# Altium footprint library Components.PcbLib: 139 footprints (part 8 of 9)
Each footprint in its own frame and in the unit in brackets; x right, y up, seen from the top. Pads: shape width x height; smd on the part's side, far side on the other; paste and mask are expansions set on the pad; w line width, h text height; cw(c..) or ccw(c..) is an arc to the next point about the centre after c.
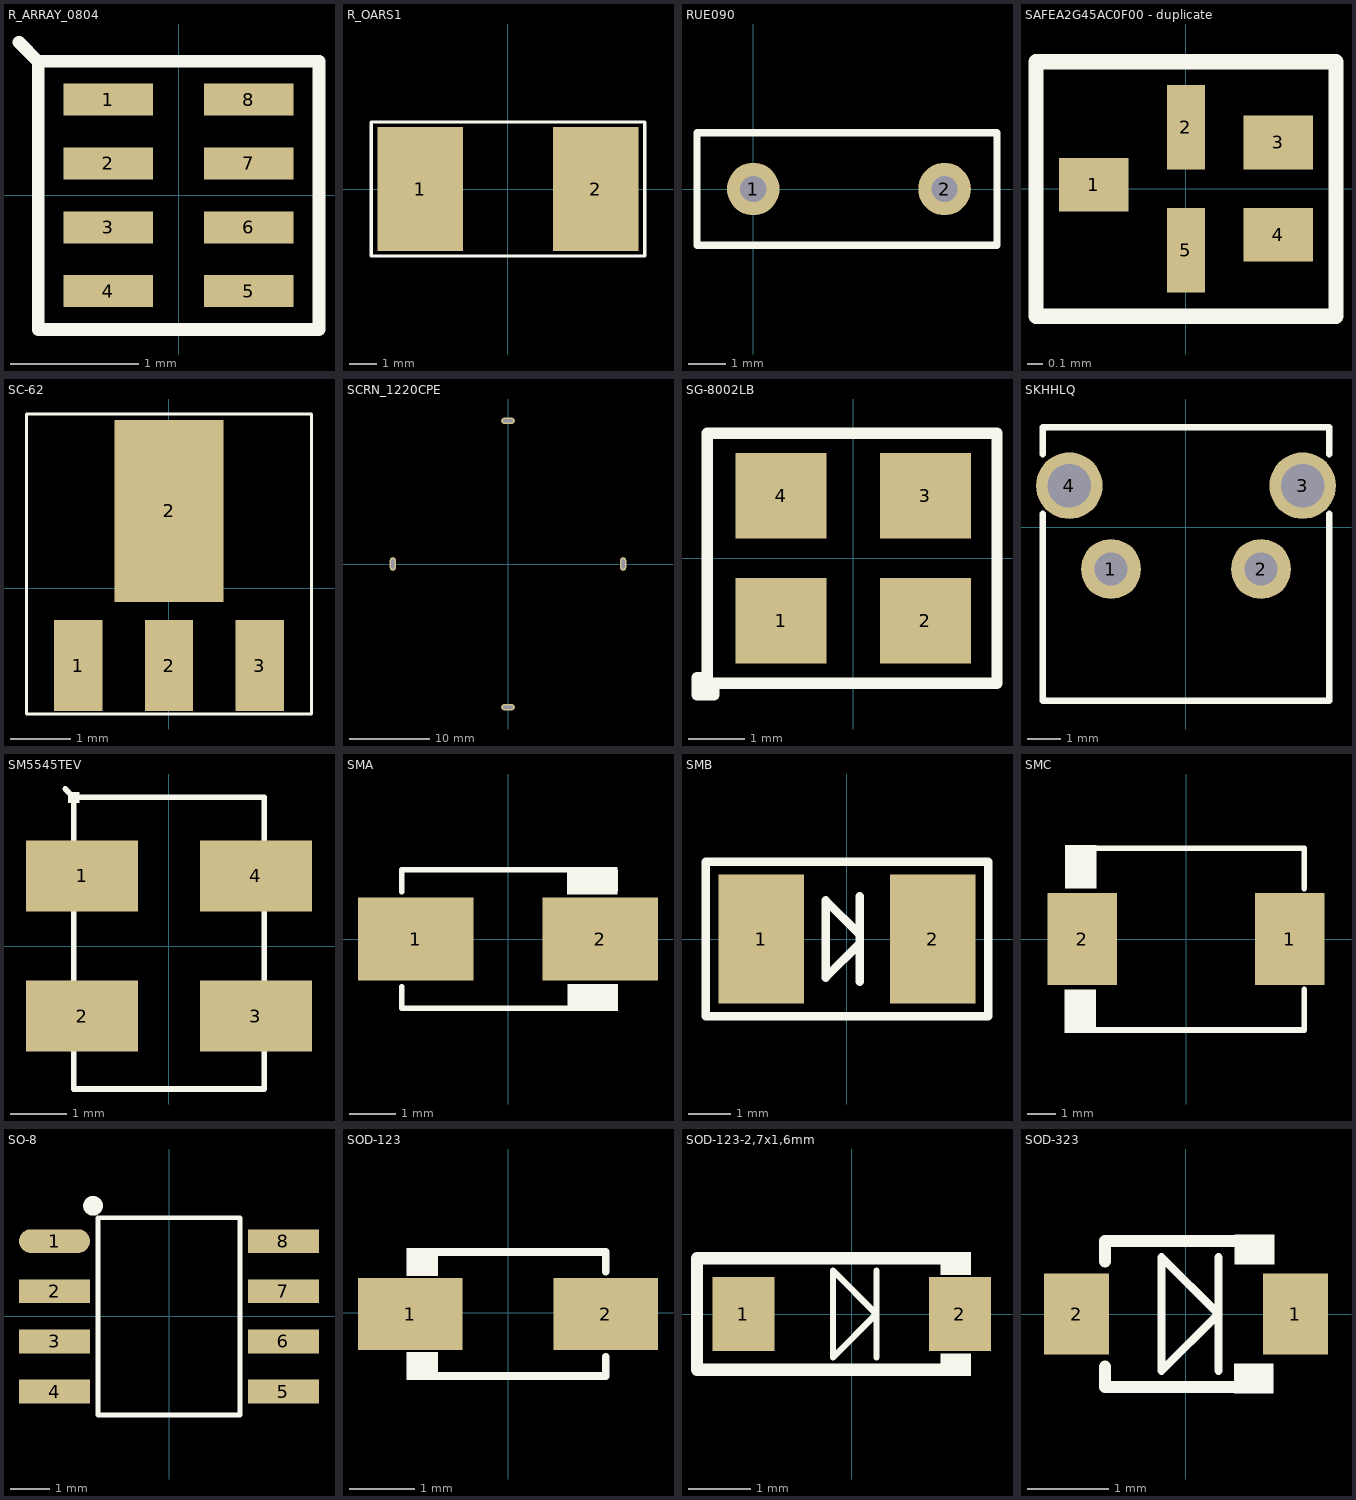
[diagram p7: the footprints below, top view; thin cyan lines are the x and y axes]

## R_ARRAY_0804 [mm]
pads (8):
  rect 0.7x0.25 smd paste-0.03 mask+0.03: 1(-0.55,0.75) 2(-0.55,0.25) 3(-0.55,-0.25) 4(-0.55,-0.75) 5(0.55,-0.75) 6(0.55,-0.25) 7(0.55,0.25) 8(0.55,0.75)
Top Overlay:
  lines w0.1: -1.25,1.2 -1.1,1.05 ; -1.1,1.05 -1.1,1.05 ; -1.1,1.05 1.1,1.05 1.1,-1.05 -1.1,-1.05 -1.1,1.05
3D body "SW3dPS-YC124.STEP": height 0.36, standoff 0, extent -0.52,-1 0.48,1

## R_OARS1 [mm]
pads (2):
  rect 3.07x4.45 smd paste-0.3 mask+0.1: 1(-3.15,0) 2(3.15,0)
Top Overlay:
  lines w0.12: -4.895,-2.4 -4.895,2.4 4.905,2.4 4.905,-2.4 -4.895,-2.4
3D body "SW3dPS-shunt.STEP": height 2.98, standoff -0.03, extent -5.55,-1.59 5.45,1.65

## RUE090 [mm]
pads (2):
  round 1.4 hole 0.7: 1(0,0) 2(5.1,0)
Top Overlay:
  lines w0.2: -1.5,-1.5 6.5,-1.5 6.5,1.5 -1.5,1.5 -1.5,-1.5
3D body "User Library-RUEF185.STEP": height 11.4, standoff -7.3, extent -2.169,-2.75 7.569,2.761

## SAFEA2G45AC0F00 - duplicate [mm]
pads (5):
  rect 0.45x0.35 smd paste-0.04 mask+0.03: 1(-0.6,0.025) 3(0.6,0.3) 4(0.6,-0.3)
  rect 0.25x0.55 smd paste-0.03 mask+0.03: 2(0,0.4) 5(0,-0.4)
Top Overlay:
  lines w0.1: -0.975,-0.83 0.975,-0.83 0.975,0.825 -0.975,0.825 -0.975,-0.83
3D body: height 0.5, standoff 0, extent -0.95,-0.8 0.95,0.8

## SC-62 [mm]
pads (4):
  rect 0.8x1.5 smd paste-0.08 mask+0.05: 1(-1.5,-1.275) 2(0,-1.275) 3(1.5,-1.275)
  rect 1.8x3 smd paste-0.08 mask+0.05: 2(0,1.275)
Top Overlay:
  lines w0.05: -2.35,-2.075 -2.35,2.875 2.35,2.875 2.35,-2.075 -2.35,-2.075
3D body "SOT-89.STEP": height 1.55, standoff 0, extent -2.3,-1.825 2.3,2.375

## SCRN_1220CPE [mm]
pads (4):
  oval 0.8x1.7 hole 0.4 slot 1.2 at 90 deg: 1(14.35,0) 2(-14.35,0)
  oval 1.7x0.8 hole 0.4 slot 1.2 at 0 deg: 3(0,-17.85) 4(0,17.85)
Top Solder:
  region: 14.85,-18.35 3.1,-18.35 3.1,-17.35 13.85,-17.35 13.85,6.75 14.85,6.75
  region: 2.2,-18.35 2.2,-17.35 -13.85,-17.35 -13.85,-6.875 -14.85,-6.875 -14.85,-18.35
  region: 5.9,18.35 5.9,17.35 -14.85,17.35 -14.85,18.35
  region: -13.85,-5.95 -14.85,-5.95 -14.85,18.35 -13.85,18.35
Bottom Solder:
  region: 0.45,18.309 0.626,18.274 0.774,18.174 0.874,18.026 0.909,17.85 0.874,17.674 0.774,17.526 0.626,17.426 0.45,17.391 0.45,17.4 -0.45,17.391 -0.626,17.426 -0.774,17.526 -0.874,17.674 -0.909,17.85 -0.874,18.026 -0.774,18.174 -0.626,18.274 -0.45,18.309 -0.45,18.3 0.45,18.3
  region: -14.809,0.45 -14.774,0.626 -14.674,0.774 -14.526,0.874 -14.35,0.909 -14.174,0.874 -14.026,0.774 -13.926,0.626 -13.891,0.45 -13.9,0.45 -13.891,-0.45 -13.926,-0.626 -14.026,-0.774 -14.174,-0.874 -14.35,-0.909 -14.526,-0.874 -14.674,-0.774 -14.774,-0.626 -14.809,-0.45 -14.8,-0.45 -14.8,0.45
  region: 0.45,-17.391 0.626,-17.426 0.774,-17.526 0.874,-17.674 0.909,-17.85 0.874,-18.026 0.774,-18.174 0.626,-18.274 0.45,-18.309 0.45,-18.3 -0.45,-18.309 -0.626,-18.274 -0.774,-18.174 -0.874,-18.026 -0.909,-17.85 -0.874,-17.674 -0.774,-17.526 -0.626,-17.426 -0.45,-17.391 -0.45,-17.4 0.45,-17.4
  region: 13.891,0.45 13.926,0.626 14.026,0.774 14.174,0.874 14.35,0.909 14.526,0.874 14.674,0.774 14.774,0.626 14.809,0.45 14.8,0.45 14.809,-0.45 14.774,-0.626 14.674,-0.774 14.526,-0.874 14.35,-0.909 14.174,-0.874 14.026,-0.774 13.926,-0.626 13.891,-0.45 13.9,-0.45 13.9,0.45
Mechanical 1:
  text "SC1" at -13.094,-18.475 h0.5
3D body: height 3, standoff 0, extent -14.409,-17.894 14.389,17.904
3D body: height 3, standoff 2.9, extent -14.46,-17.945 14.44,17.955

## SG-8002LB [mm]
pads (4):
  rect 1.6x1.5 smd paste-0.15 mask+0.08: 1(-1.27,-1.1) 2(1.27,-1.1) 3(1.27,1.1) 4(-1.27,1.1)
Top Overlay:
  lines w0.2: -2.57,-2.37 -2.57,2.2 2.53,2.2 2.53,-2.2 -2.57,-2.2 ; -2.57,-2.1 -2.75,-2.1 -2.75,-2.4 -2.45,-2.4 -2.45,-2.2
3D body: height 1.2, standoff 0, extent -2.519,-1.499 2.479,1.5

## SKHHLQ [mm]
pads (4):
  round 1.8 hole 1 mask+0.05: 1(-2.25,-1.25) 2(2.25,-1.25)
  round 2 hole 1.3 mask+0.05: 3(3.5,1.25) 4(-3.5,1.25)
Top Overlay:
  lines w0.2: -4.3,0.4 -4.3,-5.2 4.3,-5.2 4.3,0.4 ; -4.3,2.2 -4.3,3 4.3,3 4.3,2.2
3D body "SW3dPS-Alps TACT SKHH Horizontal Switch.STEP": height 7.37, standoff -3.5, extent -4.181,-5.1 4.181,2.87

## SM5545TEV [mm]
pads (4):
  rect 2x1.27 smd paste-0.12 mask+0.1: 1(-1.55,1.25) 2(-1.55,-1.25) 3(1.55,-1.25) 4(1.55,1.25)
Top Overlay:
  rectangle: -1.8,2.55 -1.6,2.75
  lines w0.1: -1.85,2.8 -1.7,2.65 ; -1.7,2.65 1.7,2.65 1.7,-2.55 -1.7,-2.55 -1.7,2.65
3D body: height 1.3, standoff 0, extent -1.699,-2.549 1.699,2.65

## SMA [mm] "Molded Diode, 2-Leads, Body 4,3x2,6mm, IPC Medium Density"
height 2.65
pads (2):
  rect 2.5x1.8 smd paste-0.2: 1(-2,0) 2(2,0)
Top Overlay:
  region: 2.38,-0.97 1.284,-0.97 1.284,-1.56 2.38,-1.56
  rectangle: 1.28,0.96 2.376,1.56
  lines w0.12: -2.3,-1.03 -2.3,-1.5 2.3,-1.5 ; -2.3,1.02 -2.3,1.5 2.3,1.5
  lines w0.2: 2.12,-1.46 2.12,-1.08 2.28,-1.08 2.28,-1.46 ; 2.14,1.46 2.14,1.06 2.28,1.06 2.28,1.46
3D body "SW3dPS-DO-214AC SMA.STEP": height 2.4, standoff 0, extent -2.65,-1.3 2.55,1.3

## SMB [mm]
pads (2):
  rect 2x3 smd paste-0.2: 1(-2,0) 2(2,0)
Top Overlay:
  lines w0.2: 0.3,1 0.3,0.1 ; -0.5,-0.9 -0.5,0.9 0.3,0.1 ; -0.5,-0.9 0.3,-0.1 ; -0.5,-0.9 -0.5,-0.9 ; 0.3,-1 0.3,-1 ; 0.3,-1 0.3,-0.1 ; 0.3,-0.1 0.3,0.1 ; -3.3,-1.8 -3.3,1.8 3.3,1.8 3.3,-1.8 -3.3,-1.8
3D body "SW3dPS-DO-214AA SMB.STEP": height 2.3, standoff 0, extent -2.75,-1.8 2.65,1.8

## SMC [mm] "Molded Diode, 2-Leads, Body 7,9x5,9mm, IPC Medium Density"
height 2.45
pads (2):
  rect 2.4x3.2 smd paste-0.2 mask+0.1: 1(3.6,0) 2(-3.6,0)
Top Overlay:
  rectangle: -4.22,-3.25 -3.124,-1.75
  rectangle: -4.2,1.75 -3.104,3.25
  lines w0.2: -4.1,-2 -4.1,-3.15 4.1,-3.15 4.1,-1.75 ; -4.1,2 -4.1,3.15 4.1,3.15 4.1,1.75
3D body "DO-214AB SMC.STEP": height 2.4, standoff 0.1, extent -3.975,-2.95 3.975,2.95

## SO-8 [mm] "SOIC, 8-Leads, Body 4,9x3,9mm (max), Pitch 1,27mm, IPC Medium Density"
height 1.75
pads (8):
  oval 1.8x0.6 smd paste-0.06 mask+0.06: 1(-2.9,1.905)
  rect 1.8x0.6 smd paste-0.06 mask+0.06: 2(-2.9,0.635) 3(-2.9,-0.635) 4(-2.9,-1.905) 5(2.9,-1.905) 6(2.9,-0.635) 7(2.9,0.635) 8(2.9,1.905)
Top Overlay:
  circle w0.25: c-1.925,2.8 r0.125
  lines w0.12: -1.8,-2.5 -1.8,2.5 1.8,2.5 1.8,-2.5 -1.8,-2.5
3D body "SW3DPS-SO-8-DEFAULT.STEP": height 1.45, standoff 0, extent -2.889,-2.45 2.889,2.452

## SOD-123 [mm]
pads (2):
  rect 1.6x1.1 smd paste-0.1 mask+0.08: 1(-1.5,-0.02) 2(1.5,-0.02)
Top Overlay:
  rectangle: -1.56,0.56 -1.07,0.99
  region: -1.07,-0.6 -1.56,-0.6 -1.56,-1.03 -1.07,-1.03
  lines w0.12: -1.5,-0.83 -1.5,-0.97 1.5,-0.97 1.5,-0.68 ; -1.5,0.79 -1.5,0.93 1.5,0.93 1.5,0.63
3D body "User Library-SOD-123_DiodesInc.STEP": height 1.42, standoff -0.03, extent -1.925,-0.9 1.925,0.8

## SOD-123-2,7x1,6mm [mm] "Molded Capacitor, 2-Leads, Body 2,7x1,6mm, IPC Medium Density"
height 1.35
pads (2):
  rect 1x1.2 smd paste-0.1 mask+0.08: 1(-1.75,0) 2(1.75,0)
Top Overlay:
  region: 1.93,-0.64 1.44,-0.64 1.44,-1 1.93,-1
  rectangle: 1.44,0.63 1.93,1
  lines w0.1: 0.4,-0.7 0.4,0.7 ; 0.4,0 0.4,0 ; 0.4,0 -0.3,0.7 -0.3,-0.7 0.4,0 ; 0.4,0 0.4,0
  lines w0.2: -1.45,-0.9 1.45,-0.9 ; -1.35,-0.9 -2.5,-0.9 -2.5,-0.85 -2.5,0.9 ; 1.45,0.9 -1.45,0.9 -2.5,0.9 ; -2.5,0.9 -2.5,0.9
3D body "SW3DPS-SOD123-DEFAULT.STEP": height 1.27, standoff 0, extent -1.9,-0.8 1.8,0.8

## SOD-323 [mm] "Molded Capacitor, 2-Leads, Body 2,7x1,6mm, IPC Medium Density"
height 1.35
pads (2):
  rect 0.8x1 smd paste-0.08 mask+0.08: 1(1.35,0) 2(-1.35,0)
Top Overlay:
  rectangle: 0.6,0.61 1.09,0.98
  region: 1.08,-0.61 0.59,-0.61 0.59,-0.98 1.08,-0.98
  lines w0.1: 0.4,-0.7 0.4,0.7 ; 0.4,0 -0.3,-0.7 -0.3,0.7 0.4,0 ; 0.4,0 0.4,0 ; 0.4,0 0.4,0
  lines w0.15: -1,-0.65 -1,-0.9 1,-0.9 ; -1,0.65 -1,0.9 1,0.9
3D body "User Library-SOD-323.step": height 1.1, standoff 0, extent -1.3,-0.65 1.3,0.7